# Altium footprint library BARKO_PCBLIB.PcbLib: 531 footprints (part 15 of 34)
Each footprint in its own frame and in the unit in brackets; x right, y up, seen from the top. Pads: shape width x height; smd on the part's side, far side on the other; paste and mask are expansions set on the pad; w line width, h text height; cw(c..) or ccw(c..) is an arc to the next point about the centre after c.
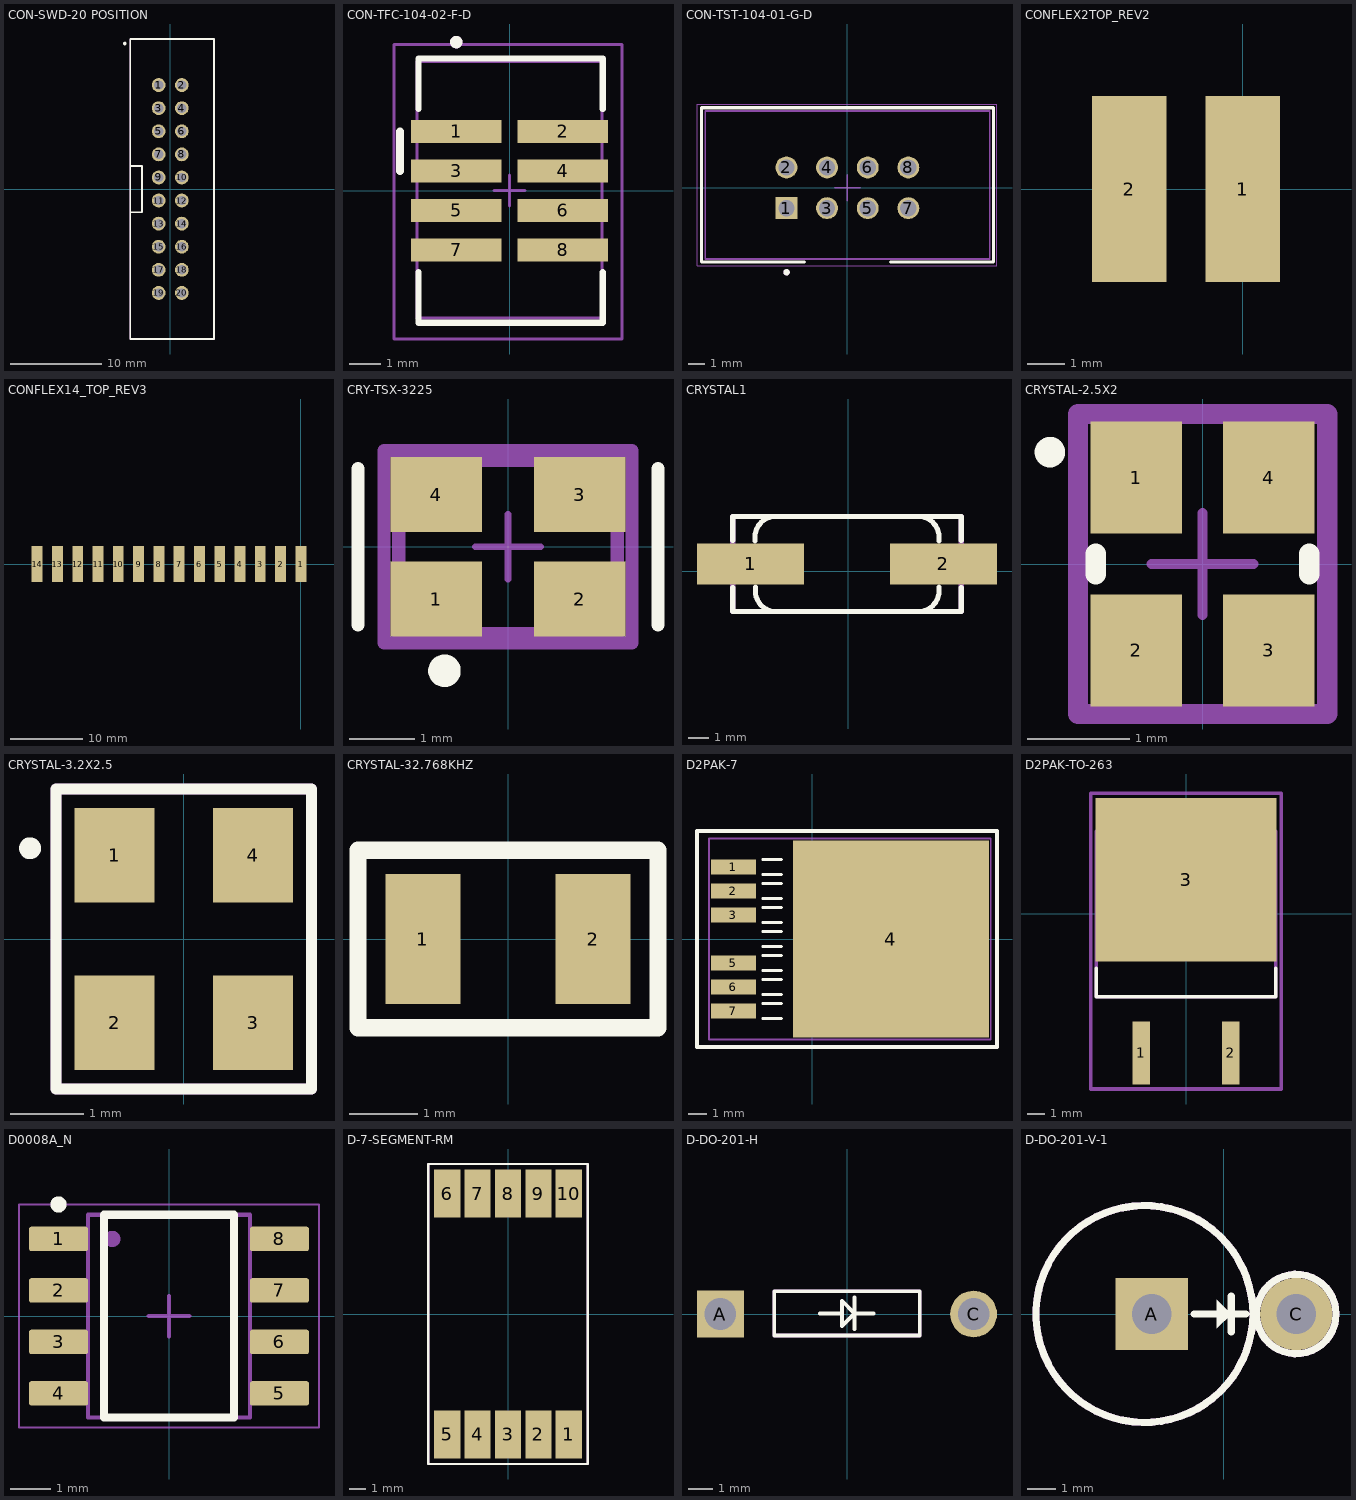
[diagram p14: the footprints below, top view; thin cyan lines are the x and y axes]

## CON-SWD-20 POSITION [mm]
pads (20):
  round 1.52 hole 1.02 mask+0.05: 1(-1.27,11.43) 2(1.27,11.43) 3(-1.27,8.89) 4(1.27,8.89) 5(-1.27,6.35) 6(1.27,6.35) 7(-1.27,3.81) 8(1.27,3.81) 9(-1.27,1.27) 10(1.27,1.27) 11(-1.27,-1.27) 12(1.27,-1.27) 13(-1.27,-3.81) 14(1.27,-3.81) 15(-1.27,-6.35) 16(1.27,-6.35) 17(-1.27,-8.89) 18(1.27,-8.89) 19(-1.27,-11.43) 20(1.27,-11.43)
Top Overlay:
  circle w0.2: c-5,16 r0.1
  lines w0.2: -4.394,-2.566 -3.124,-2.566 -3.124,2.514 -4.394,2.514 ; -4.4,-16.5 -4.4,16.5 4.826,16.5 4.826,-16.5 -4.4,-16.5
ASM Top:
  lines w0.152: -4.4,-16.5 -4.4,16.5 4.826,16.5 4.826,-16.5 -4.4,-16.5
  text ".designator" at 0,0.3 h0.8
3D body: height 0.25, standoff 0, extent -4.191,1.753 -4.191,1.753
3D body "swd 20 pin 2.54mm header.stp": height 8.89, standoff -3.3, extent -4.394,-16.536 4.877,16.484

## CON-TFC-104-02-F-D [mm]
pads (8):
  rect 2.92x0.74 smd: 1(-1.715,1.905) 2(1.715,1.905) 3(-1.715,0.635) 4(1.715,0.635) 5(-1.715,-0.635) 6(1.715,-0.635) 7(-1.715,-1.905) 8(1.715,-1.905)
Top Overlay:
  circle w0.2: c-1.715,4.78 r0.1
  lines w0.2: -2.935,-2.625 -2.935,-4.25 3,-4.25 3,-2.625 ; -2.935,2.625 -2.935,4.25 3,4.25 3,2.625
  lines w0.254: -3.525,0.635 -3.525,1.905
Mechanical 13:
  circle w0.2: c-1.715,4.78 r0.1
Mechanical 15:
  lines w0.1: -0.5,0 0.5,0 ; 0,-0.5 0,0.5 ; -3.725,-4.775 -3.725,4.7 3.625,4.7 3.625,-4.775 -3.725,-4.775
ASM Top:
  lines w0.1: -2.985,-4.105 -2.985,4.155 2.975,4.155 2.975,-4.105 -2.985,-4.105
  text ".designator" at 0,0 h1
3D body "TFC-104-02-F-D.stp": height 5.73, standoff -0.01, extent -2.985,-4.125 2.985,4.13

## CON-TST-104-01-G-D [mm]
pads (8):
  rect 1.37x1.37 hole 1.02: 1(-3.81,-1.27)
  round 1.37 hole 1.02: 2(-3.81,1.27) 3(-1.27,-1.27) 4(-1.27,1.27) 5(1.27,-1.27) 6(1.27,1.27) 7(3.81,-1.27) 8(3.81,1.27)
Top Overlay:
  circle w0.2: c-3.8,-5.275 r0.1
  lines w0.2: -2.7,-4.635 -9.125,-4.635 -9.125,5 9.125,5 9.125,-4.635 2.7,-4.635
Mechanical 13:
  circle w0.2: c-3.8,-5.275 r0.1
Mechanical 15:
  lines w0.05: -9.4,-4.885 9.35,-4.885 9.35,5.225 -9.4,5.225 -9.4,-4.885
  lines w0.1: -0.8,0 0,0 ; 0,-0.8 0,0 ; 0,0.8 0,0 ; 0.8,0 0,0
ASM Top:
  lines w0.1: -8.89,-4.45 -8.89,4.8 8.89,4.8 8.89,-4.45 -8.89,-4.45
  text ".designator" at 0,0 h1
3D body "TST-104-01-G-D.stp": height 8.89, standoff -3.3, extent -8.865,-4.445 8.915,4.826

## CONFLEX2TOP_REV2 [mm]
pads (2):
  rect 2x5 smd paste-0.05: 1(0,0) 2(-3.048,0)

## CONFLEX14_TOP_REV3 [mm]
pads (14):
  rect 1.5x5 smd paste-0.05: 1(0,0) 2(-2.794,0) 3(-5.588,0) 4(-8.382,0) 5(-11.176,0) 6(-13.97,0) 7(-16.764,0) 8(-19.558,0) 9(-22.352,0) 10(-25.146,0) 11(-27.94,0) 12(-30.734,0) 13(-33.528,0) 14(-36.322,0)

## CRY-TSX-3225 [mm]
pads (4):
  rect 1.4x1.15 smd paste+0 mask+0: 1(-1.1,-0.8) 2(1.1,-0.8) 3(1.1,0.8) 4(-1.1,0.8)
Top Overlay:
  circle w0.25: c-0.975,-1.9 r0.125
  lines w0.2: -2.3,-1.2 -2.3,1.2 ; 2.3,-1.2 2.3,1.2
Mechanical 15:
  lines w0.1: -0.5,0 0.5,0 ; 0,-0.5 0,0.5
  lines w0.2: -1.9,-1.475 1.9,-1.475 1.9,1.475 -1.9,1.475 -1.9,-1.475
ASM Top:
  lines w0.2: -1.675,-1.325 1.675,-1.325 1.675,1.325 -1.675,1.325 -1.675,-1.325
  text ".Designator" at 0,0.188 h1
3D body "Crys_EPSON_TSX-3225_16_0000MF18X-AC0_eec.STEP": height 0.6, standoff 0, extent -1.6,-1.25 1.6,1.25

## CRYSTAL1 [mil]
pads (2):
  rect 210x80 smd mask+1.97: 1(-191,14) 2(187,14)
Top Overlay:
  lines w10: -226,-32 -226,-79 222,-79 222,-32 ; -226,60 -226,107 222,107 222,60 ; -182,59 cw(c-141,66) -148,107 ; -181,-31 ccw(c-140.5,-38.5) -148,-79 ; 144,-79 ccw(c137,-38) 178,-31 ; 144,107 cw(c137,66) 178,59
ASM Top:
  lines w10: -226,-79 222,-79 222,107 -226,107 -226,-79
  text ".designator" at -44,6 h31.5
3D body "HC49_US.step": height 167.83, standoff 2.47, extent -249.88,-76 250.12,109.04

## CRYSTAL-2.5X2 [mm]
height 0.8
pads (4):
  rect 0.9x1.1 smd mask+0.05: 1(-0.65,0.85) 2(-0.65,-0.85) 3(0.65,-0.85) 4(0.65,0.85)
Top Overlay:
  circle w0.2: c-1.5,1.1 r0.05
  lines w0.2: -1.05,-0.1 -1.05,0.1 ; 1.05,-0.1 1.05,0.1
Mechanical 15:
  lines w0.1: -0.5,0 0.5,0 ; 0,-0.5 0,0.5
  lines w0.2: -1.225,-1.475 -1.225,1.475 1.225,1.475 1.225,-1.475 -1.225,-1.475
ASM Top:
  lines w0.2: -1.225,-1.475 1.225,-1.475 1.225,1.475 -1.225,1.475 -1.225,-1.475
  text ".designator" at -0.483,-0.102 h0.8
3D body "Crys_ECS_International_ECS-2033-130-BN_eec.STEP": height 0.95, standoff 0, extent -1,-1.25 1,1.25

## CRYSTAL-3.2X2.5 [mm]
pads (4):
  rect 1.1x1.3 smd: 1(-0.95,1.15) 2(-0.95,-1.15) 3(0.95,-1.15) 4(0.95,1.15)
Top Overlay:
  circle w0.2: c-2.108,1.245 r0.05
  lines w0.152: -1.753,-2.057 1.753,-2.057 1.753,2.057 -1.753,2.057 -1.753,-2.057
ASM Top:
  lines w0.152: -1.753,-2.057 1.753,-2.057 1.753,2.057 -1.753,2.057 -1.753,-2.057
  text ".designator" at -0.483,-0.102 h0.8
3D body "Crystal-3.2X2.5.STEP": height 0.82, standoff 0, extent -1.275,-1.6 1.225,1.6

## CRYSTAL-32.768KHZ [mm]
pads (2):
  rect 1.1x1.9 smd: 1(-1.25,0) 2(1.25,0)
Top Overlay:
  lines w0.254: -2.2,-1.3 2.2,-1.3 2.2,1.3 -2.2,1.3 -2.2,-1.3
ASM Top:
  lines w0.2: -2.2,-1.3 2.2,-1.3 2.2,1.3 -2.2,1.3 -2.2,-1.3
  text ".designator" at -0.7,-0.148 h0.8
3D body "ABS07.STEP": height 0.9, standoff 0.01, extent -1.65,-0.749 1.55,0.749

## D2PAK-7 [mil]
height 190.94
pads (7):
  rect 94x32 smd: 1(-164,150) 2(-164,100) 3(-164,50) 5(-164,-50) 6(-164,-100) 7(-164,-150)
  rect 408x410 smd paste-393.7: 4(164,0)
Top Overlay:
  lines w6: -103,-166 -64,-166 ; -103,-134 -64,-134 ; -103,-116 -64,-116 ; -103,-84 -64,-84 ; -103,-66 -64,-66 ; -103,-34 -64,-34 ; -103,-16 -64,-16 ; -103,16 -64,16 ; -103,34 -64,34 ; -103,66 -64,66 ; -103,84 -64,84 ; -103,116 -64,116 ; -103,134 -64,134 ; -103,166 -64,166
  lines w7.87: -240,-225 385,-225 385,225 -240,225 -240,-225
Top Paste:
  region: 279.27,196.85 279.27,125.98 354.08,125.98 354.08,196.85
  region: 279.27,116.14 279.27,45.28 354.08,45.28 354.08,116.14
  region: 279.27,-45.28 279.27,-116.14 354.08,-116.14 354.08,-45.28
  region: 279.27,35.43 279.27,-35.43 354.08,-35.43 354.08,35.43
  region: 279.27,-125.98 279.27,-196.85 354.08,-196.85 354.08,-125.98
  region: 178.22,-125.98 178.22,-196.85 253.03,-196.85 253.03,-125.98
  region: 178.22,35.43 178.22,-35.43 253.03,-35.43 253.03,35.43
  region: 178.22,-45.28 178.22,-116.14 253.03,-116.14 253.03,-45.28
  region: 178.22,116.14 178.22,45.28 253.03,45.28 253.03,116.14
  region: 178.22,196.85 178.22,125.98 253.03,125.98 253.03,196.85
  region: 77.17,-125.98 77.17,-196.85 151.98,-196.85 151.98,-125.98
  region: 77.17,35.43 77.17,-35.43 151.98,-35.43 151.98,35.43
  region: 77.17,-45.28 77.17,-116.14 151.98,-116.14 151.98,-45.28
  region: 77.17,116.14 77.17,45.28 151.98,45.28 151.98,116.14
  region: 77.17,196.85 77.17,125.98 151.98,125.98 151.98,196.85
  region: -23.88,-125.98 -23.88,-196.85 50.93,-196.85 50.93,-125.98
  region: -23.88,35.43 -23.88,-35.43 50.93,-35.43 50.93,35.43
  region: -23.88,-45.28 -23.88,-116.14 50.93,-116.14 50.93,-45.28
  region: -23.88,116.14 -23.88,45.28 50.93,45.28 50.93,116.14
  region: -23.88,196.85 -23.88,125.98 50.93,125.98 50.93,196.85
Mechanical 15:
  lines w6: -240,-225 -240,225 385,225 385,-225 -240,-225
ASM Top:
  lines w3.94: -215,-209 -215,209 372,209 372,-209 -215,-209
  text ".designator" at 152.13,34 h31.5
3D body "D2PAK-7.step": height 177.17, standoff -0.04, extent -212.96,-204.72 404.12,204.72

## D2PAK-TO-263 [mm]
pads (3):
  rect 1x3.6 smd paste-0.05 mask+0: 1(-2.54,-7.9) 2(2.54,-7.9)
  rect 10.3x9.3 smd paste-10: 3(0,1.95)
Top Overlay:
  lines w0.2: -5.1,-3.075 -5.1,-4.7 5.1,-4.7 5.1,-3.075
Top Paste:
  rectangle: -5,-2.206 -3.2,-0.306
  rectangle: -2.95,-2.206 -1.15,-0.306
  rectangle: 1.15,-2.206 2.95,-0.306
  rectangle: -0.9,-2.206 0.9,-0.306
  rectangle: 3.2,-2.206 5,-0.306
  rectangle: -5,0.06 -3.2,1.96
  rectangle: -2.95,0.06 -1.15,1.96
  rectangle: 1.15,0.06 2.95,1.96
  rectangle: -0.9,0.06 0.9,1.96
  rectangle: 3.2,0.06 5,1.96
  rectangle: -5,2.327 -3.2,4.227
  rectangle: -2.95,2.327 -1.15,4.227
  rectangle: 1.15,2.327 2.95,4.227
  rectangle: -0.9,2.327 0.9,4.227
  rectangle: 3.2,2.327 5,4.227
  rectangle: 3.2,4.594 5,6.494
  rectangle: -0.9,4.594 0.9,6.494
  rectangle: 1.15,4.594 2.95,6.494
  rectangle: -2.95,4.594 -1.15,6.494
  rectangle: -5,4.594 -3.2,6.494
Mechanical 15:
  lines w0.2: -5.4,-9.95 5.4,-9.95 5.4,6.85 -5.4,6.85 -5.4,-9.95
Mechanical 16:
  lines w0.1: -0.5,0 0.5,0 ; 0,-0.5 0,0.5
ASM Top:
  lines w0.2: -5.1,-4.7 5.1,-4.7 5.1,4.7 -5.1,4.7 -5.1,-4.7
  text ".designator" at 0,0 h0.8
3D body "Trans_IXYS_IXTA3N150HV_eec.STEP": height 4.9, standoff 0, extent -5,-9.537 5,5.8

## D0008A_N [mm] "SOIC, 8-Leads, Body 5x4mm, Pitch 1.27mm, IPC Medium Density"
height 1.75
pads (8):
  rrect17% 1.45x0.6 smd: 1(-2.725,1.905) 2(-2.725,0.635) 3(-2.725,-0.635) 4(-2.725,-1.905) 5(2.725,-1.905) 6(2.725,-0.635) 7(2.725,0.635) 8(2.725,1.905)
Top Overlay:
  circle w0.2: c-2.725,2.755 r0.1
  lines w0.2: -1.6,-2.5 -1.6,2.5 1.6,2.5 1.6,-2.5 -1.6,-2.5
Mechanical 15:
  lines w0.05: -3.7,-2.75 -3.7,2.75 3.7,2.75 3.7,-2.75 -3.7,-2.75
  lines w0.1: -0.5,0 0.5,0 ; 0,-0.5 0,0.5
ASM Top:
  circle w0.2: c-1.397,1.905 r0.1
  lines w0.1: -2,-2.5 2,-2.5 2,2.5 -2,2.5 -2,-2.5
  text ".designator" at -1.397,-0.254 h0.8
3D body "SOIC-8akaD0008AakaM08A.stp": height 1.63, standoff 0, extent -3,-2.45 3,2.45

## D-7-SEGMENT-RM [mm]
pads (10):
  rect 1.65x3 smd mask+0: 1(3.8,-7.5) 2(1.9,-7.5) 3(0,-7.5) 4(-1.9,-7.5) 5(-3.8,-7.5) 6(-3.8,7.5) 7(-1.9,7.5) 8(0,7.5) 9(1.9,7.5) 10(3.8,7.5)
Top Overlay:
  lines w0.152: -4.978,-9.347 4.978,-9.347 4.978,9.347 -4.978,9.347 -4.978,-9.347
ASM Top:
  lines w0.152: -4.978,-9.347 -4.978,9.347 4.978,9.347 4.978,-9.347 -4.978,-9.347
  text ".designator" at -1.651,-0.813 h0.8

## D-DO-201-H [mil]
pads (2):
  rect 74x74 hole 50: A(-200,0)
  round 74 hole 50: C(200,0)
Top Overlay:
  lines w6: -43,1 -8,1 ; 12,-24 12,26 ; 42,1 12,1 ; -8,1 -8,-19 12,1 ; -8,1 -8,21 12,1 ; -115,-34 -115,36 115,36 115,-34 -115,-34
ASM Top:
  lines w6: -115,-34 115,-34 115,36 -115,36 -115,-34
  text ".designator" at -87,-13 h31.5
3D body "Diod DO-41 Horizontal.STEP": height 108.74, standoff -136.34, extent -216.86,-54.48 217,53

## D-DO-201-V-1 [mil]
pads (2):
  rect 100x100 hole 55 mask+0: A(-100,0)
  round 100 hole 55 mask+0: C(100,0)
Top Overlay:
  circle w10: c100,0 r55
  circle w10: c-110,0 r150
  region: -10,-20 -10,20 10,0
  lines w10: -41,0 30,0 ; 10,-25 10,25
ASM Top:
  circle w10: c-110,0 r150
  circle w10: c100,0 r55
  text ".designator" at -205,-100 h31.5
3D body "DO-201AV-Vertical_200.STEP": height 617.72, standoff -118.11, extent -211.22,-110 125,110.47